# Altium schematic symbol library jlcpcb_2025_04_resistors_extended_1210.schlib: 2670 symbols (part 8 of 14) (continued)
## CR1210J30683G
designator R?  Resistance: 68kΩ  (hidden comment: *)
Resistor, 68kΩ, ±5%, 750mW, 200V, ±200ppm/℃, -55℃~+125℃, SMD 1210; Manufacturer: Uniroyal; Manufacturer Part Number: CR1210J30683G; Supplier 1: LCSC; Supplier Part Number 1: C102495; JLCPCB Part Number: C102495; Power Rating: 750mW; Category: Resistors; Package Size: 1210; JLCPCB Basic Part: Yes; Tolerance: ±5%; Voltage Rating: 200V; Temperature Coefficient: ±200ppm/℃; Temperature Rating: -55℃~+125℃; ComponentLink1Description: Datasheet; ComponentLink1URL: https://wmsc.lcsc.com/wmsc/upload/file/pdf/v2/lcsc/2304140030_LIZ-Elec-CR1210J30683G_C102495.pdf; ComponentLink2Description: JLCPCB Part URL; ComponentLink2URL: https://jlcpcb.com/partdetail/C102495
pins: 1, 2
1 alternate drawing of the same symbol

## CR1210J30750G
designator R?  Resistance: 75Ω  (hidden comment: *)
Resistor, 75Ω, ±5%, 750mW, 200V, ±200ppm/℃, -55℃~+125℃, SMD 1210; Manufacturer: Uniroyal; Manufacturer Part Number: CR1210J30750G; Supplier 1: LCSC; Supplier Part Number 1: C102497; JLCPCB Part Number: C102497; Power Rating: 750mW; Category: Resistors; Package Size: 1210; JLCPCB Basic Part: Yes; Tolerance: ±5%; Voltage Rating: 200V; Temperature Coefficient: ±200ppm/℃; Temperature Rating: -55℃~+125℃; ComponentLink1Description: Datasheet; ComponentLink1URL: https://wmsc.lcsc.com/wmsc/upload/file/pdf/v2/lcsc/2304140030_LIZ-Elec-CR1210J30750G_C102497.pdf; ComponentLink2Description: JLCPCB Part URL; ComponentLink2URL: https://jlcpcb.com/partdetail/C102497
pins: 1, 2
1 alternate drawing of the same symbol

## CR1210J30751G
designator R?  Resistance: 750Ω  (hidden comment: *)
Resistor, 750Ω, ±5%, 200V, SMD 1210; Manufacturer: Uniroyal; Manufacturer Part Number: CR1210J30751G; Supplier 1: LCSC; Supplier Part Number 1: C102498; JLCPCB Part Number: C102498; Category: Resistors; Package Size: 1210; JLCPCB Basic Part: Yes; Tolerance: ±5%; Voltage Rating: 200V; ComponentLink1Description: Datasheet; ComponentLink1URL: https://wmsc.lcsc.com/wmsc/upload/file/pdf/v2/lcsc/2304140030_LIZ-Elec-CR1210J30751G_C102498.pdf; ComponentLink2Description: JLCPCB Part URL; ComponentLink2URL: https://jlcpcb.com/partdetail/C102498
pins: 1, 2
1 alternate drawing of the same symbol

## CR1210J30820G
designator R?  Resistance: 82Ω  (hidden comment: *)
Resistor, 82Ω, ±5%, 750mW, 200V, ±200ppm/℃, -55℃~+125℃, SMD 1210; Manufacturer: Uniroyal; Manufacturer Part Number: CR1210J30820G; Supplier 1: LCSC; Supplier Part Number 1: C102502; JLCPCB Part Number: C102502; Power Rating: 750mW; Category: Resistors; Package Size: 1210; JLCPCB Basic Part: Yes; Tolerance: ±5%; Voltage Rating: 200V; Temperature Coefficient: ±200ppm/℃; Temperature Rating: -55℃~+125℃; ComponentLink1Description: Datasheet; ComponentLink1URL: https://wmsc.lcsc.com/wmsc/upload/file/pdf/v2/lcsc/2304140030_LIZ-Elec-CR1210J30820G_C102502.pdf; ComponentLink2Description: JLCPCB Part URL; ComponentLink2URL: https://jlcpcb.com/partdetail/C102502
pins: 1, 2
1 alternate drawing of the same symbol

## CR1210JR020P05Z
designator R?  Resistance: 20mΩ  (hidden comment: *)
Resistor, 20mΩ, ±5%, 500mW, 200V, -55℃~+155℃, SMD 1210; Manufacturer: Uniroyal; Manufacturer Part Number: CR1210JR020P05Z; Supplier 1: LCSC; Supplier Part Number 1: C149712; JLCPCB Part Number: C149712; Power Rating: 500mW; Category: Resistors; Package Size: 1210; JLCPCB Basic Part: Yes; Tolerance: ±5%; Voltage Rating: 200V; Temperature Rating: -55℃~+155℃; ComponentLink1Description: Datasheet; ComponentLink1URL: https://wmsc.lcsc.com/wmsc/upload/file/pdf/v2/lcsc/2304140030_Ever-Ohms-Tech-CR1210JR020P05Z_C149712.pdf; ComponentLink2Description: JLCPCB Part URL; ComponentLink2URL: https://jlcpcb.com/partdetail/C149712
pins: 1, 2
1 alternate drawing of the same symbol

## CR1210JR050P05R
designator R?  Resistance: 50mΩ  (hidden comment: *)
Resistor, 50mΩ, ±5%, 500mW, 200V, -55℃~+155℃, SMD 1210; Manufacturer: Uniroyal; Manufacturer Part Number: CR1210JR050P05R; Supplier 1: LCSC; Supplier Part Number 1: C149714; JLCPCB Part Number: C149714; Power Rating: 500mW; Category: Resistors; Package Size: 1210; JLCPCB Basic Part: Yes; Tolerance: ±5%; Voltage Rating: 200V; Temperature Rating: -55℃~+155℃; ComponentLink1Description: Datasheet; ComponentLink1URL: https://wmsc.lcsc.com/wmsc/upload/file/pdf/v2/lcsc/2304140030_Ever-Ohms-Tech-CR1210JR050P05R_C149714.pdf; ComponentLink2Description: JLCPCB Part URL; ComponentLink2URL: https://jlcpcb.com/partdetail/C149714
pins: 1, 2
1 alternate drawing of the same symbol

## CR1210JR091P05R
designator R?  Resistance: 91mΩ  (hidden comment: *)
Resistor, 91mΩ, ±5%, 500mW, 200V, -55℃~+155℃, SMD 1210; Manufacturer: Uniroyal; Manufacturer Part Number: CR1210JR091P05R; Supplier 1: LCSC; Supplier Part Number 1: C149715; JLCPCB Part Number: C149715; Power Rating: 500mW; Category: Resistors; Package Size: 1210; JLCPCB Basic Part: Yes; Tolerance: ±5%; Voltage Rating: 200V; Temperature Rating: -55℃~+155℃; ComponentLink1Description: Datasheet; ComponentLink1URL: https://wmsc.lcsc.com/wmsc/upload/file/pdf/v2/lcsc/2304140030_Ever-Ohms-Tech-CR1210JR091P05R_C149715.pdf; ComponentLink2Description: JLCPCB Part URL; ComponentLink2URL: https://jlcpcb.com/partdetail/C149715
pins: 1, 2
1 alternate drawing of the same symbol

## CR1210JR120P05R
designator R?  Resistance: 120mΩ  (hidden comment: *)
Resistor, 120mΩ, ±5%, 500mW, 200V, -55℃~+155℃, SMD 1210; Manufacturer: Uniroyal; Manufacturer Part Number: CR1210JR120P05R; Supplier 1: LCSC; Supplier Part Number 1: C149716; JLCPCB Part Number: C149716; Power Rating: 500mW; Category: Resistors; Package Size: 1210; JLCPCB Basic Part: Yes; Tolerance: ±5%; Voltage Rating: 200V; Temperature Rating: -55℃~+155℃; ComponentLink1Description: Datasheet; ComponentLink1URL: https://wmsc.lcsc.com/wmsc/upload/file/pdf/v2/lcsc/2304140030_Ever-Ohms-Tech-CR1210JR120P05R_C149716.pdf; ComponentLink2Description: JLCPCB Part URL; ComponentLink2URL: https://jlcpcb.com/partdetail/C149716
pins: 1, 2
1 alternate drawing of the same symbol

## CR1210JR150P05R
designator R?  Resistance: 150mΩ  (hidden comment: *)
Resistor, 150mΩ, ±5%, 500mW, 200V, -55℃~+155℃, SMD 1210; Manufacturer: Uniroyal; Manufacturer Part Number: CR1210JR150P05R; Supplier 1: LCSC; Supplier Part Number 1: C149717; JLCPCB Part Number: C149717; Power Rating: 500mW; Category: Resistors; Package Size: 1210; JLCPCB Basic Part: Yes; Tolerance: ±5%; Voltage Rating: 200V; Temperature Rating: -55℃~+155℃; ComponentLink1Description: Datasheet; ComponentLink1URL: https://wmsc.lcsc.com/wmsc/upload/file/pdf/v2/lcsc/2304140030_Ever-Ohms-Tech-CR1210JR150P05R_C149717.pdf; ComponentLink2Description: JLCPCB Part URL; ComponentLink2URL: https://jlcpcb.com/partdetail/C149717
pins: 1, 2
1 alternate drawing of the same symbol

## CR1210JR220P05R
designator R?  Resistance: 220mΩ  (hidden comment: *)
Resistor, 220mΩ, ±5%, 500mW, 200V, -55℃~+155℃, SMD 1210; Manufacturer: Uniroyal; Manufacturer Part Number: CR1210JR220P05R; Supplier 1: LCSC; Supplier Part Number 1: C149718; JLCPCB Part Number: C149718; Power Rating: 500mW; Category: Resistors; Package Size: 1210; JLCPCB Basic Part: Yes; Tolerance: ±5%; Voltage Rating: 200V; Temperature Rating: -55℃~+155℃; ComponentLink1Description: Datasheet; ComponentLink1URL: https://wmsc.lcsc.com/wmsc/upload/file/pdf/v2/lcsc/2304140030_Ever-Ohms-Tech-CR1210JR220P05R_C149718.pdf; ComponentLink2Description: JLCPCB Part URL; ComponentLink2URL: https://jlcpcb.com/partdetail/C149718
pins: 1, 2
1 alternate drawing of the same symbol

## CR1210JR300P05R
designator R?  Resistance: 300mΩ  (hidden comment: *)
Resistor, 300mΩ, ±5%, 500mW, 200V, -55℃~+155℃, SMD 1210; Manufacturer: Uniroyal; Manufacturer Part Number: CR1210JR300P05R; Supplier 1: LCSC; Supplier Part Number 1: C149719; JLCPCB Part Number: C149719; Power Rating: 500mW; Category: Resistors; Package Size: 1210; JLCPCB Basic Part: Yes; Tolerance: ±5%; Voltage Rating: 200V; Temperature Rating: -55℃~+155℃; ComponentLink1Description: Datasheet; ComponentLink1URL: https://wmsc.lcsc.com/wmsc/upload/file/pdf/v2/lcsc/2304140030_Ever-Ohms-Tech-CR1210JR300P05R_C149719.pdf; ComponentLink2Description: JLCPCB Part URL; ComponentLink2URL: https://jlcpcb.com/partdetail/C149719
pins: 1, 2
1 alternate drawing of the same symbol

## CR1210JR500P05R
designator R?  Resistance: 500mΩ  (hidden comment: *)
Resistor, 500mΩ, ±5%, 500mW, 200V, -55℃~+155℃, SMD 1210; Manufacturer: Uniroyal; Manufacturer Part Number: CR1210JR500P05R; Supplier 1: LCSC; Supplier Part Number 1: C149722; JLCPCB Part Number: C149722; Power Rating: 500mW; Category: Resistors; Package Size: 1210; JLCPCB Basic Part: Yes; Tolerance: ±5%; Voltage Rating: 200V; Temperature Rating: -55℃~+155℃; ComponentLink1Description: Datasheet; ComponentLink1URL: https://wmsc.lcsc.com/wmsc/upload/file/pdf/v2/lcsc/2304140030_Ever-Ohms-Tech-CR1210JR500P05R_C149722.pdf; ComponentLink2Description: JLCPCB Part URL; ComponentLink2URL: https://jlcpcb.com/partdetail/C149722
pins: 1, 2
1 alternate drawing of the same symbol

## CR1210JR560P05R
designator R?  Resistance: 560mΩ  (hidden comment: *)
Resistor, 560mΩ, ±5%, 500mW, 200V, -55℃~+155℃, SMD 1210; Manufacturer: Uniroyal; Manufacturer Part Number: CR1210JR560P05R; Supplier 1: LCSC; Supplier Part Number 1: C149721; JLCPCB Part Number: C149721; Power Rating: 500mW; Category: Resistors; Package Size: 1210; JLCPCB Basic Part: Yes; Tolerance: ±5%; Voltage Rating: 200V; Temperature Rating: -55℃~+155℃; ComponentLink1Description: Datasheet; ComponentLink1URL: https://wmsc.lcsc.com/wmsc/upload/file/pdf/v2/lcsc/2304140030_Ever-Ohms-Tech-CR1210JR560P05R_C149721.pdf; ComponentLink2Description: JLCPCB Part URL; ComponentLink2URL: https://jlcpcb.com/partdetail/C149721
pins: 1, 2
1 alternate drawing of the same symbol

## CR1210JR620P05R
designator R?  Resistance: 620mΩ  (hidden comment: *)
Resistor, 620mΩ, ±5%, 500mW, 200V, -55℃~+155℃, SMD 1210; Manufacturer: Uniroyal; Manufacturer Part Number: CR1210JR620P05R; Supplier 1: LCSC; Supplier Part Number 1: C149723; JLCPCB Part Number: C149723; Power Rating: 500mW; Category: Resistors; Package Size: 1210; JLCPCB Basic Part: Yes; Tolerance: ±5%; Voltage Rating: 200V; Temperature Rating: -55℃~+155℃; ComponentLink1Description: Datasheet; ComponentLink1URL: https://wmsc.lcsc.com/wmsc/upload/file/pdf/v2/lcsc/2304140030_Ever-Ohms-Tech-CR1210JR620P05R_C149723.pdf; ComponentLink2Description: JLCPCB Part URL; ComponentLink2URL: https://jlcpcb.com/partdetail/C149723
pins: 1, 2
1 alternate drawing of the same symbol

## CR1210JR800P05R
designator R?  Resistance: 800mΩ  (hidden comment: *)
Resistor, 800mΩ, ±5%, 500mW, 200V, -55℃~+155℃, SMD 1210; Manufacturer: Uniroyal; Manufacturer Part Number: CR1210JR800P05R; Supplier 1: LCSC; Supplier Part Number 1: C149725; JLCPCB Part Number: C149725; Power Rating: 500mW; Category: Resistors; Package Size: 1210; JLCPCB Basic Part: Yes; Tolerance: ±5%; Voltage Rating: 200V; Temperature Rating: -55℃~+155℃; ComponentLink1Description: Datasheet; ComponentLink1URL: https://wmsc.lcsc.com/wmsc/upload/file/pdf/v2/lcsc/2304140030_Ever-Ohms-Tech-CR1210JR800P05R_C149725.pdf; ComponentLink2Description: JLCPCB Part URL; ComponentLink2URL: https://jlcpcb.com/partdetail/C149725
pins: 1, 2
1 alternate drawing of the same symbol

## CR-10FA7--200R
designator R?  Resistance: 200Ω  (hidden comment: *)
Resistor, 200Ω, ±1%, 333.333mW, 200V, -55℃~+155℃, SMD 1210; Manufacturer: Uniroyal; Manufacturer Part Number: CR-10FA7--200R; Supplier 1: LCSC; Supplier Part Number 1: C285233; JLCPCB Part Number: C285233; Power Rating: 333.333mW; Category: Resistors; Package Size: 1210; JLCPCB Basic Part: Yes; Tolerance: ±1%; Voltage Rating: 200V; Temperature Rating: -55℃~+155℃; ComponentLink1Description: Datasheet; ComponentLink1URL: https://wmsc.lcsc.com/wmsc/upload/file/pdf/v2/lcsc/2304140030_Viking-Tech-CR-10FA7--200R_C285233.pdf; ComponentLink2Description: JLCPCB Part URL; ComponentLink2URL: https://jlcpcb.com/partdetail/C285233
pins: 1, 2
1 alternate drawing of the same symbol

## CR-10FL7---4R7
designator R?  Resistance: 4.7Ω  (hidden comment: *)
Resistor, 4.7Ω, ±1%, 333.333mW, 200V, ±200ppm/℃, -55℃~+155℃, SMD 1210; Manufacturer: Uniroyal; Manufacturer Part Number: CR-10FL7---4R7; Supplier 1: LCSC; Supplier Part Number 1: C468527; JLCPCB Part Number: C468527; Power Rating: 333.333mW; Category: Resistors; Package Size: 1210; JLCPCB Basic Part: Yes; Tolerance: ±1%; Voltage Rating: 200V; Temperature Coefficient: ±200ppm/℃; Temperature Rating: -55℃~+155℃; ComponentLink1Description: Datasheet; ComponentLink1URL: https://wmsc.lcsc.com/wmsc/upload/file/pdf/v2/lcsc/2304140030_Viking-Tech-CR-10FL7---4R7_C468527.pdf; ComponentLink2Description: JLCPCB Part URL; ComponentLink2URL: https://jlcpcb.com/partdetail/C468527
pins: 1, 2
1 alternate drawing of the same symbol

## CR-10JP7---10R
designator R?  Resistance: 10Ω  (hidden comment: *)
Resistor, 10Ω, ±5%, 333.333mW, ±100ppm/℃, SMD 1210; Manufacturer: Uniroyal; Manufacturer Part Number: CR-10JP7---10R; Supplier 1: LCSC; Supplier Part Number 1: C881911; JLCPCB Part Number: C881911; Power Rating: 333.333mW; Category: Resistors; Package Size: 1210; JLCPCB Basic Part: Yes; Tolerance: ±5%; Temperature Coefficient: ±100ppm/℃; ComponentLink1Description: Datasheet; ComponentLink1URL: https://wmsc.lcsc.com/wmsc/upload/file/pdf/v2/lcsc/2304140030_Viking-Tech-CR-10JP7---10R_C881911.pdf; ComponentLink2Description: JLCPCB Part URL; ComponentLink2URL: https://jlcpcb.com/partdetail/C881911
pins: 1, 2
1 alternate drawing of the same symbol

## CRCW12101M00FKEA
designator R?  Resistance: 1MΩ  (hidden comment: *)
Resistor, 1MΩ, ±1%, 500mW, ±100ppm/℃, -55℃~+155℃, SMD 1210; Manufacturer: Uniroyal; Manufacturer Part Number: CRCW12101M00FKEA; Supplier 1: LCSC; Supplier Part Number 1: C844444; JLCPCB Part Number: C844444; Power Rating: 500mW; Category: Resistors; Package Size: 1210; JLCPCB Basic Part: Yes; Tolerance: ±1%; Temperature Coefficient: ±100ppm/℃; Temperature Rating: -55℃~+155℃; ComponentLink1Description: Datasheet; ComponentLink1URL: https://wmsc.lcsc.com/wmsc/upload/file/pdf/v2/lcsc/2312131902_Vishay-Intertech-CRCW12101M00FKEA_C844444.pdf; ComponentLink2Description: JLCPCB Part URL; ComponentLink2URL: https://jlcpcb.com/partdetail/C844444
pins: 1, 2
1 alternate drawing of the same symbol

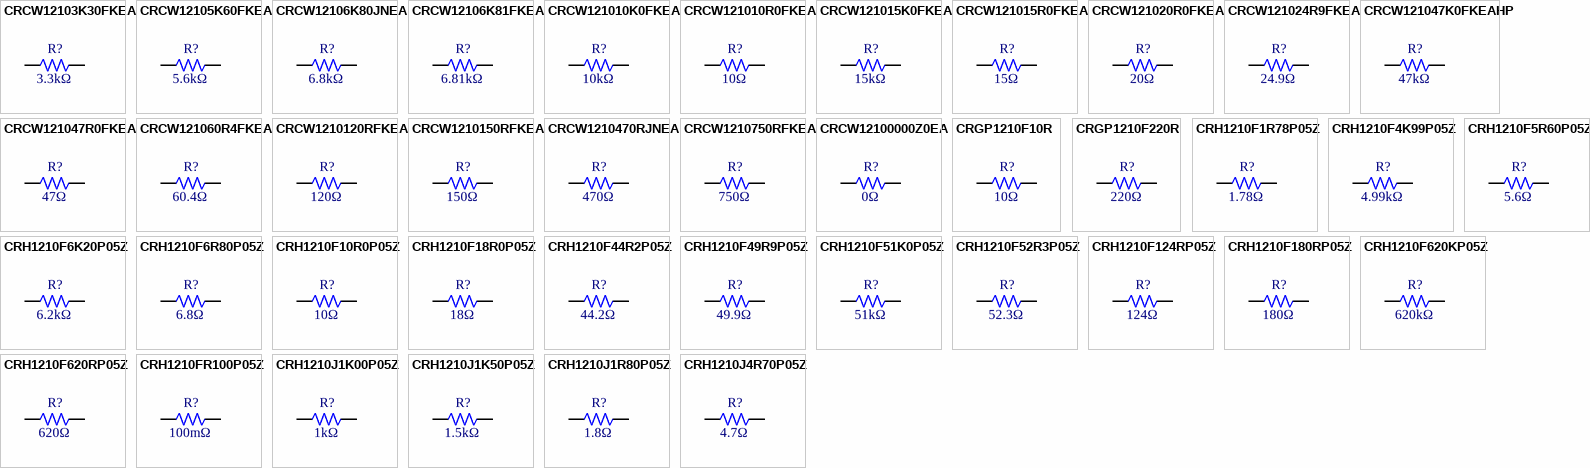
[diagram p38: symbols CRCW12103K30FKEA to CRH1210J4R70P05Z]

## CRCW12103K30FKEA
designator R?  Resistance: 3.3kΩ  (hidden comment: *)
Resistor, 3.3kΩ, ±1%, 500mW, 300V, ±100ppm/℃, -55℃~+155℃, SMD 1210; Manufacturer: Uniroyal; Manufacturer Part Number: CRCW12103K30FKEA; Supplier 1: LCSC; Supplier Part Number 1: C2077955; JLCPCB Part Number: C2077955; Power Rating: 500mW; Category: Resistors; Package Size: 1210; JLCPCB Basic Part: Yes; Tolerance: ±1%; Voltage Rating: 300V; Temperature Coefficient: ±100ppm/℃; Temperature Rating: -55℃~+155℃; ComponentLink1Description: Datasheet; ComponentLink1URL: https://wmsc.lcsc.com/wmsc/upload/file/pdf/v2/lcsc/2304140030_Vishay-Intertech-CRCW12103K30FKEA_C2077955.pdf; ComponentLink2Description: JLCPCB Part URL; ComponentLink2URL: https://jlcpcb.com/partdetail/C2077955
pins: 1, 2
1 alternate drawing of the same symbol

## CRCW12105K60FKEA
designator R?  Resistance: 5.6kΩ  (hidden comment: *)
Resistor, 5.6kΩ, ±1%, 500mW, 300V, ±100ppm/K, -55℃~+155℃, SMD 1210; Manufacturer: Uniroyal; Manufacturer Part Number: CRCW12105K60FKEA; Supplier 1: LCSC; Supplier Part Number 1: C2079048; JLCPCB Part Number: C2079048; Power Rating: 500mW; Category: Resistors; Package Size: 1210; JLCPCB Basic Part: Yes; Tolerance: ±1%; Voltage Rating: 300V; Temperature Coefficient: ±100ppm/K; Temperature Rating: -55℃~+155℃; ComponentLink1Description: Datasheet; ComponentLink1URL: https://wmsc.lcsc.com/wmsc/upload/file/pdf/v2/lcsc/2304140030_Vishay-Intertech-CRCW12105K60FKEA_C2079048.pdf; ComponentLink2Description: JLCPCB Part URL; ComponentLink2URL: https://jlcpcb.com/partdetail/C2079048
pins: 1, 2
1 alternate drawing of the same symbol

## CRCW12106K80JNEA
designator R?  Resistance: 6.8kΩ  (hidden comment: *)
Resistor, 6.8kΩ, ±5%, 500mW, 200V, ±200ppm/℃, -55℃~+155℃, SMD 1210; Manufacturer: Uniroyal; Manufacturer Part Number: CRCW12106K80JNEA; Supplier 1: LCSC; Supplier Part Number 1: C2080931; JLCPCB Part Number: C2080931; Power Rating: 500mW; Category: Resistors; Package Size: 1210; JLCPCB Basic Part: Yes; Tolerance: ±5%; Voltage Rating: 200V; Temperature Coefficient: ±200ppm/℃; Temperature Rating: -55℃~+155℃; ComponentLink1Description: Datasheet; ComponentLink1URL: https://wmsc.lcsc.com/wmsc/upload/file/pdf/v2/lcsc/2304140030_Vishay-Intertech-CRCW12106K80JNEA_C2080931.pdf; ComponentLink2Description: JLCPCB Part URL; ComponentLink2URL: https://jlcpcb.com/partdetail/C2080931
pins: 1, 2
1 alternate drawing of the same symbol

## CRCW12106K81FKEA
designator R?  Resistance: 6.81kΩ  (hidden comment: *)
Resistor, 6.81kΩ, ±1%, 500mW, 300V, ±100ppm/℃, -55℃~+155℃, SMD 1210; Manufacturer: Uniroyal; Manufacturer Part Number: CRCW12106K81FKEA; Supplier 1: LCSC; Supplier Part Number 1: C2081092; JLCPCB Part Number: C2081092; Power Rating: 500mW; Category: Resistors; Package Size: 1210; JLCPCB Basic Part: Yes; Tolerance: ±1%; Voltage Rating: 300V; Temperature Coefficient: ±100ppm/℃; Temperature Rating: -55℃~+155℃; ComponentLink1Description: Datasheet; ComponentLink1URL: https://wmsc.lcsc.com/wmsc/upload/file/pdf/v2/lcsc/2304140030_Vishay-Intertech-CRCW12106K81FKEA_C2081092.pdf; ComponentLink2Description: JLCPCB Part URL; ComponentLink2URL: https://jlcpcb.com/partdetail/C2081092
pins: 1, 2
1 alternate drawing of the same symbol

## CRCW121010K0FKEA
designator R?  Resistance: 10kΩ  (hidden comment: *)
Resistor, 10kΩ, ±1%, 500mW, 300V, ±100ppm/K, -55℃~+155℃, SMD 1210; Manufacturer: Uniroyal; Manufacturer Part Number: CRCW121010K0FKEA; Supplier 1: LCSC; Supplier Part Number 1: C844441; JLCPCB Part Number: C844441; Power Rating: 500mW; Category: Resistors; Package Size: 1210; JLCPCB Basic Part: Yes; Tolerance: ±1%; Voltage Rating: 300V; Temperature Coefficient: ±100ppm/K; Temperature Rating: -55℃~+155℃; ComponentLink1Description: Datasheet; ComponentLink1URL: https://wmsc.lcsc.com/wmsc/upload/file/pdf/v2/lcsc/2304140030_Vishay-Intertech-CRCW121010K0FKEA_C844441.pdf; ComponentLink2Description: JLCPCB Part URL; ComponentLink2URL: https://jlcpcb.com/partdetail/C844441
pins: 1, 2
1 alternate drawing of the same symbol

## CRCW121010R0FKEA
designator R?  Resistance: 10Ω  (hidden comment: *)
Resistor, 10Ω, ±1%, 500mW, 300V, ±100ppm/℃, -55℃~+155℃, SMD 1210; Manufacturer: Uniroyal; Manufacturer Part Number: CRCW121010R0FKEA; Supplier 1: LCSC; Supplier Part Number 1: C844881; JLCPCB Part Number: C844881; Power Rating: 500mW; Category: Resistors; Package Size: 1210; JLCPCB Basic Part: Yes; Tolerance: ±1%; Voltage Rating: 300V; Temperature Coefficient: ±100ppm/℃; Temperature Rating: -55℃~+155℃; ComponentLink1Description: Datasheet; ComponentLink1URL: https://wmsc.lcsc.com/wmsc/upload/file/pdf/v2/lcsc/2304140030_Vishay-Intertech-CRCW121010R0FKEA_C844881.pdf; ComponentLink2Description: JLCPCB Part URL; ComponentLink2URL: https://jlcpcb.com/partdetail/C844881
pins: 1, 2
1 alternate drawing of the same symbol

## CRCW121015K0FKEA
designator R?  Resistance: 15kΩ  (hidden comment: *)
Resistor, 15kΩ, ±1%, 500mW, ±100ppm/℃, -55℃~+155℃, SMD 1210; Manufacturer: Uniroyal; Manufacturer Part Number: CRCW121015K0FKEA; Supplier 1: LCSC; Supplier Part Number 1: C4085234; JLCPCB Part Number: C4085234; Power Rating: 500mW; Category: Resistors; Package Size: 1210; JLCPCB Basic Part: Yes; Tolerance: ±1%; Temperature Coefficient: ±100ppm/℃; Temperature Rating: -55℃~+155℃; ComponentLink1Description: Datasheet; ComponentLink1URL: https://wmsc.lcsc.com/wmsc/upload/file/pdf/v2/lcsc/2312130958_Vishay-Intertech-CRCW121015K0FKEA_C4085234.pdf; ComponentLink2Description: JLCPCB Part URL; ComponentLink2URL: https://jlcpcb.com/partdetail/C4085234
pins: 1, 2
1 alternate drawing of the same symbol

## CRCW121015R0FKEA
designator R?  Resistance: 15Ω  (hidden comment: *)
Resistor, 15Ω, ±1%, 500mW, 200V, ±100ppm/℃, -55℃~+155℃, SMD 1210; Manufacturer: Uniroyal; Manufacturer Part Number: CRCW121015R0FKEA; Supplier 1: LCSC; Supplier Part Number 1: C2077909; JLCPCB Part Number: C2077909; Power Rating: 500mW; Category: Resistors; Package Size: 1210; JLCPCB Basic Part: Yes; Tolerance: ±1%; Voltage Rating: 200V; Temperature Coefficient: ±100ppm/℃; Temperature Rating: -55℃~+155℃; ComponentLink1Description: Datasheet; ComponentLink1URL: https://wmsc.lcsc.com/wmsc/upload/file/pdf/v2/lcsc/2304140030_Vishay-Intertech-CRCW121015R0FKEA_C2077909.pdf; ComponentLink2Description: JLCPCB Part URL; ComponentLink2URL: https://jlcpcb.com/partdetail/C2077909
pins: 1, 2
1 alternate drawing of the same symbol

## CRCW121020R0FKEA
designator R?  Resistance: 20Ω  (hidden comment: *)
Resistor, 20Ω, ±1%, 500mW, ±100ppm/℃, -55℃~+155℃, SMD 1210; Manufacturer: Uniroyal; Manufacturer Part Number: CRCW121020R0FKEA; Supplier 1: LCSC; Supplier Part Number 1: C4106877; JLCPCB Part Number: C4106877; Power Rating: 500mW; Category: Resistors; Package Size: 1210; JLCPCB Basic Part: Yes; Tolerance: ±1%; Temperature Coefficient: ±100ppm/℃; Temperature Rating: -55℃~+155℃; ComponentLink1Description: Datasheet; ComponentLink1URL: https://wmsc.lcsc.com/wmsc/upload/file/pdf/v2/lcsc/2312131010_Vishay-Intertech-CRCW121020R0FKEA_C4106877.pdf; ComponentLink2Description: JLCPCB Part URL; ComponentLink2URL: https://jlcpcb.com/partdetail/C4106877
pins: 1, 2
1 alternate drawing of the same symbol

## CRCW121024R9FKEA
designator R?  Resistance: 24.9Ω  (hidden comment: *)
Resistor, 24.9Ω, ±1%, 500mW, 200V, ±100ppm/℃, -55℃~+155℃, SMD 1210; Manufacturer: Uniroyal; Manufacturer Part Number: CRCW121024R9FKEA; Supplier 1: LCSC; Supplier Part Number 1: C2077946; JLCPCB Part Number: C2077946; Power Rating: 500mW; Category: Resistors; Package Size: 1210; JLCPCB Basic Part: Yes; Tolerance: ±1%; Voltage Rating: 200V; Temperature Coefficient: ±100ppm/℃; Temperature Rating: -55℃~+155℃; ComponentLink1Description: Datasheet; ComponentLink1URL: https://wmsc.lcsc.com/wmsc/upload/file/pdf/v2/lcsc/2304140030_Vishay-Intertech-CRCW121024R9FKEA_C2077946.pdf; ComponentLink2Description: JLCPCB Part URL; ComponentLink2URL: https://jlcpcb.com/partdetail/C2077946
pins: 1, 2
1 alternate drawing of the same symbol

## CRCW121047K0FKEAHP
designator R?  Resistance: 47kΩ  (hidden comment: *)
Resistor, 47kΩ, ±1%, 750mW, 200V, ±100ppm/℃, -55℃~+155℃, SMD 1210; Manufacturer: Uniroyal; Manufacturer Part Number: CRCW121047K0FKEAHP; Supplier 1: LCSC; Supplier Part Number 1: C2079113; JLCPCB Part Number: C2079113; Power Rating: 750mW; Category: Resistors; Package Size: 1210; JLCPCB Basic Part: Yes; Tolerance: ±1%; Voltage Rating: 200V; Temperature Coefficient: ±100ppm/℃; Temperature Rating: -55℃~+155℃; ComponentLink1Description: Datasheet; ComponentLink1URL: https://wmsc.lcsc.com/wmsc/upload/file/pdf/v2/lcsc/2304140030_Vishay-Intertech-CRCW121047K0FKEAHP_C2079113.pdf; ComponentLink2Description: JLCPCB Part URL; ComponentLink2URL: https://jlcpcb.com/partdetail/C2079113
pins: 1, 2
1 alternate drawing of the same symbol

## CRCW121047R0FKEA
designator R?  Resistance: 47Ω  (hidden comment: *)
Resistor, 47Ω, ±1%, 500mW, ±100ppm/℃, -55℃~+155℃, SMD 1210; Manufacturer: Uniroyal; Manufacturer Part Number: CRCW121047R0FKEA; Supplier 1: LCSC; Supplier Part Number 1: C3966771; JLCPCB Part Number: C3966771; Power Rating: 500mW; Category: Resistors; Package Size: 1210; JLCPCB Basic Part: Yes; Tolerance: ±1%; Temperature Coefficient: ±100ppm/℃; Temperature Rating: -55℃~+155℃; ComponentLink1Description: Datasheet; ComponentLink1URL: https://wmsc.lcsc.com/wmsc/upload/file/pdf/v2/lcsc/2312121734_Vishay-Intertech-CRCW121047R0FKEA_C3966771.pdf; ComponentLink2Description: JLCPCB Part URL; ComponentLink2URL: https://jlcpcb.com/partdetail/C3966771
pins: 1, 2
1 alternate drawing of the same symbol

## CRCW121060R4FKEA
designator R?  Resistance: 60.4Ω  (hidden comment: *)
Resistor, 60.4Ω, ±1%, 500mW, 300V, ±100ppm/℃, -55℃~+155℃, SMD 1210; Manufacturer: Uniroyal; Manufacturer Part Number: CRCW121060R4FKEA; Supplier 1: LCSC; Supplier Part Number 1: C2077840; JLCPCB Part Number: C2077840; Power Rating: 500mW; Category: Resistors; Package Size: 1210; JLCPCB Basic Part: Yes; Tolerance: ±1%; Voltage Rating: 300V; Temperature Coefficient: ±100ppm/℃; Temperature Rating: -55℃~+155℃; ComponentLink1Description: Datasheet; ComponentLink1URL: https://wmsc.lcsc.com/wmsc/upload/file/pdf/v2/lcsc/2304140030_Vishay-Intertech-CRCW121060R4FKEA_C2077840.pdf; ComponentLink2Description: JLCPCB Part URL; ComponentLink2URL: https://jlcpcb.com/partdetail/C2077840
pins: 1, 2
1 alternate drawing of the same symbol

## CRCW1210120RFKEA
designator R?  Resistance: 120Ω  (hidden comment: *)
Resistor, 120Ω, ±1%, 500mW, 200V, ±100ppm/℃, -55℃~+155℃, SMD 1210; Manufacturer: Uniroyal; Manufacturer Part Number: CRCW1210120RFKEA; Supplier 1: LCSC; Supplier Part Number 1: C844443; JLCPCB Part Number: C844443; Power Rating: 500mW; Category: Resistors; Package Size: 1210; JLCPCB Basic Part: Yes; Tolerance: ±1%; Voltage Rating: 200V; Temperature Coefficient: ±100ppm/℃; Temperature Rating: -55℃~+155℃; ComponentLink1Description: Datasheet; ComponentLink1URL: https://wmsc.lcsc.com/wmsc/upload/file/pdf/v2/lcsc/2304140030_Vishay-Intertech-CRCW1210120RFKEA_C844443.pdf; ComponentLink2Description: JLCPCB Part URL; ComponentLink2URL: https://jlcpcb.com/partdetail/C844443
pins: 1, 2
1 alternate drawing of the same symbol

## CRCW1210150RFKEA
designator R?  Resistance: 150Ω  (hidden comment: *)
Resistor, 150Ω, ±1%, 500mW, 300V, ±100ppm/K, -55℃~+155℃, SMD 1210; Manufacturer: Uniroyal; Manufacturer Part Number: CRCW1210150RFKEA; Supplier 1: LCSC; Supplier Part Number 1: C844045; JLCPCB Part Number: C844045; Power Rating: 500mW; Category: Resistors; Package Size: 1210; JLCPCB Basic Part: Yes; Tolerance: ±1%; Voltage Rating: 300V; Temperature Coefficient: ±100ppm/K; Temperature Rating: -55℃~+155℃; ComponentLink1Description: Datasheet; ComponentLink1URL: https://wmsc.lcsc.com/wmsc/upload/file/pdf/v2/lcsc/2304140030_Vishay-Intertech-CRCW1210150RFKEA_C844045.pdf; ComponentLink2Description: JLCPCB Part URL; ComponentLink2URL: https://jlcpcb.com/partdetail/C844045
pins: 1, 2
1 alternate drawing of the same symbol

## CRCW1210470RJNEA
designator R?  Resistance: 470Ω  (hidden comment: *)
Resistor, 470Ω, ±5%, 500mW, 200V, ±200ppm/K, -55℃~+155℃, SMD 1210; Manufacturer: Uniroyal; Manufacturer Part Number: CRCW1210470RJNEA; Supplier 1: LCSC; Supplier Part Number 1: C242478; JLCPCB Part Number: C242478; Power Rating: 500mW; Category: Resistors; Package Size: 1210; JLCPCB Basic Part: Yes; Tolerance: ±5%; Voltage Rating: 200V; Temperature Coefficient: ±200ppm/K; Temperature Rating: -55℃~+155℃; ComponentLink1Description: Datasheet; ComponentLink1URL: https://wmsc.lcsc.com/wmsc/upload/file/pdf/v2/lcsc/2304140030_Vishay-Intertech-CRCW1210470RJNEA_C242478.pdf; ComponentLink2Description: JLCPCB Part URL; ComponentLink2URL: https://jlcpcb.com/partdetail/C242478
pins: 1, 2
1 alternate drawing of the same symbol

## CRCW1210750RFKEA
designator R?  Resistance: 750Ω  (hidden comment: *)
Resistor, 750Ω, ±1%, 500mW, 200V, ±100ppm/℃, -55℃~+155℃, SMD 1210; Manufacturer: Uniroyal; Manufacturer Part Number: CRCW1210750RFKEA; Supplier 1: LCSC; Supplier Part Number 1: C2079066; JLCPCB Part Number: C2079066; Power Rating: 500mW; Category: Resistors; Package Size: 1210; JLCPCB Basic Part: Yes; Tolerance: ±1%; Voltage Rating: 200V; Temperature Coefficient: ±100ppm/℃; Temperature Rating: -55℃~+155℃; ComponentLink1Description: Datasheet; ComponentLink1URL: https://wmsc.lcsc.com/wmsc/upload/file/pdf/v2/lcsc/2304140030_Vishay-Intertech-CRCW1210750RFKEA_C2079066.pdf; ComponentLink2Description: JLCPCB Part URL; ComponentLink2URL: https://jlcpcb.com/partdetail/C2079066
pins: 1, 2
1 alternate drawing of the same symbol

## CRCW12100000Z0EA
designator R?  Resistance: 0Ω  (hidden comment: *)
Resistor, 0Ω, 500mW, -55℃~+155℃, SMD 1210; Manufacturer: Uniroyal; Manufacturer Part Number: CRCW12100000Z0EA; Supplier 1: LCSC; Supplier Part Number 1: C844880; JLCPCB Part Number: C844880; Power Rating: 500mW; Category: Resistors; Package Size: 1210; JLCPCB Basic Part: Yes; Temperature Rating: -55℃~+155℃; ComponentLink1Description: Datasheet; ComponentLink1URL: https://wmsc.lcsc.com/wmsc/upload/file/pdf/v2/lcsc/2312131902_Vishay-Intertech-CRCW12100000Z0EA_C844880.pdf; ComponentLink2Description: JLCPCB Part URL; ComponentLink2URL: https://jlcpcb.com/partdetail/C844880
pins: 1, 2
1 alternate drawing of the same symbol

## CRGP1210F10R
designator R?  Resistance: 10Ω  (hidden comment: *)
Resistor, 10Ω, ±1%, 750mW, ±400ppm/℃, -55℃~+155℃, SMD 1210; Manufacturer: Uniroyal; Manufacturer Part Number: CRGP1210F10R; Supplier 1: LCSC; Supplier Part Number 1: C4104464; JLCPCB Part Number: C4104464; Power Rating: 750mW; Category: Resistors; Package Size: 1210; JLCPCB Basic Part: Yes; Tolerance: ±1%; Temperature Coefficient: ±400ppm/℃; Temperature Rating: -55℃~+155℃; ComponentLink1Description: Datasheet; ComponentLink2Description: JLCPCB Part URL; ComponentLink2URL: https://jlcpcb.com/partdetail/C4104464
pins: 1, 2
1 alternate drawing of the same symbol

## CRGP1210F220R
designator R?  Resistance: 220Ω  (hidden comment: *)
Resistor, 220Ω, ±1%, 750mW, ±100ppm/℃, -55℃~+155℃, SMD 1210; Manufacturer: Uniroyal; Manufacturer Part Number: CRGP1210F220R; Supplier 1: LCSC; Supplier Part Number 1: C3917340; JLCPCB Part Number: C3917340; Power Rating: 750mW; Category: Resistors; Package Size: 1210; JLCPCB Basic Part: Yes; Tolerance: ±1%; Temperature Coefficient: ±100ppm/℃; Temperature Rating: -55℃~+155℃; ComponentLink1Description: Datasheet; ComponentLink1URL: https://wmsc.lcsc.com/wmsc/upload/file/pdf/v2/lcsc/2403041535_TE-Connectivity-CRGP1210F220R_C3917340.pdf; ComponentLink2Description: JLCPCB Part URL; ComponentLink2URL: https://jlcpcb.com/partdetail/C3917340
pins: 1, 2
1 alternate drawing of the same symbol

## CRH1210F1R78P05Z
designator R?  Resistance: 1.78Ω  (hidden comment: *)
Resistor, 1.78Ω, ±1%, 660mW, 200V, ±400ppm/℃, -55℃~+155℃, SMD 1210; Manufacturer: Uniroyal; Manufacturer Part Number: CRH1210F1R78P05Z; Supplier 1: LCSC; Supplier Part Number 1: C174387; JLCPCB Part Number: C174387; Power Rating: 660mW; Category: Resistors; Package Size: 1210; JLCPCB Basic Part: Yes; Tolerance: ±1%; Voltage Rating: 200V; Temperature Coefficient: ±400ppm/℃; Temperature Rating: -55℃~+155℃; ComponentLink1Description: Datasheet; ComponentLink1URL: https://wmsc.lcsc.com/wmsc/upload/file/pdf/v2/lcsc/2304140030_Ever-Ohms-Tech-CRH1210F1R78P05Z_C174387.pdf; ComponentLink2Description: JLCPCB Part URL; ComponentLink2URL: https://jlcpcb.com/partdetail/C174387
pins: 1, 2
1 alternate drawing of the same symbol

## CRH1210F4K99P05Z
designator R?  Resistance: 4.99kΩ  (hidden comment: *)
Resistor, 4.99kΩ, ±1%, 660mW, 200V, ±100ppm/℃, -55℃~+155℃, SMD 1210; Manufacturer: Uniroyal; Manufacturer Part Number: CRH1210F4K99P05Z; Supplier 1: LCSC; Supplier Part Number 1: C174514; JLCPCB Part Number: C174514; Power Rating: 660mW; Category: Resistors; Package Size: 1210; JLCPCB Basic Part: Yes; Tolerance: ±1%; Voltage Rating: 200V; Temperature Coefficient: ±100ppm/℃; Temperature Rating: -55℃~+155℃; ComponentLink1Description: Datasheet; ComponentLink1URL: https://wmsc.lcsc.com/wmsc/upload/file/pdf/v2/lcsc/2304140030_Ever-Ohms-Tech-CRH1210F4K99P05Z_C174514.pdf; ComponentLink2Description: JLCPCB Part URL; ComponentLink2URL: https://jlcpcb.com/partdetail/C174514
pins: 1, 2
1 alternate drawing of the same symbol

## CRH1210F5R60P05Z
designator R?  Resistance: 5.6Ω  (hidden comment: *)
Resistor, 5.6Ω, ±1%, 660mW, 200V, ±400ppm/℃, -55℃~+155℃, SMD 1210; Manufacturer: Uniroyal; Manufacturer Part Number: CRH1210F5R60P05Z; Supplier 1: LCSC; Supplier Part Number 1: C174396; JLCPCB Part Number: C174396; Power Rating: 660mW; Category: Resistors; Package Size: 1210; JLCPCB Basic Part: Yes; Tolerance: ±1%; Voltage Rating: 200V; Temperature Coefficient: ±400ppm/℃; Temperature Rating: -55℃~+155℃; ComponentLink1Description: Datasheet; ComponentLink1URL: https://wmsc.lcsc.com/wmsc/upload/file/pdf/v2/lcsc/2304140030_Ever-Ohms-Tech-CRH1210F5R60P05Z_C174396.pdf; ComponentLink2Description: JLCPCB Part URL; ComponentLink2URL: https://jlcpcb.com/partdetail/C174396
pins: 1, 2
1 alternate drawing of the same symbol

## CRH1210F6K20P05Z
designator R?  Resistance: 6.2kΩ  (hidden comment: *)
Resistor, 6.2kΩ, ±1%, 660mW, 200V, ±100ppm/℃, -55℃~+155℃, SMD 1210; Manufacturer: Uniroyal; Manufacturer Part Number: CRH1210F6K20P05Z; Supplier 1: LCSC; Supplier Part Number 1: C174518; JLCPCB Part Number: C174518; Power Rating: 660mW; Category: Resistors; Package Size: 1210; JLCPCB Basic Part: Yes; Tolerance: ±1%; Voltage Rating: 200V; Temperature Coefficient: ±100ppm/℃; Temperature Rating: -55℃~+155℃; ComponentLink1Description: Datasheet; ComponentLink1URL: https://wmsc.lcsc.com/wmsc/upload/file/pdf/v2/lcsc/2304140030_Ever-Ohms-Tech-CRH1210F6K20P05Z_C174518.pdf; ComponentLink2Description: JLCPCB Part URL; ComponentLink2URL: https://jlcpcb.com/partdetail/C174518
pins: 1, 2
1 alternate drawing of the same symbol

## CRH1210F6R80P05Z
designator R?  Resistance: 6.8Ω  (hidden comment: *)
Resistor, 6.8Ω, ±1%, 660mW, 200V, ±400ppm/℃, -55℃~+155℃, SMD 1210; Manufacturer: Uniroyal; Manufacturer Part Number: CRH1210F6R80P05Z; Supplier 1: LCSC; Supplier Part Number 1: C174398; JLCPCB Part Number: C174398; Power Rating: 660mW; Category: Resistors; Package Size: 1210; JLCPCB Basic Part: Yes; Tolerance: ±1%; Voltage Rating: 200V; Temperature Coefficient: ±400ppm/℃; Temperature Rating: -55℃~+155℃; ComponentLink1Description: Datasheet; ComponentLink1URL: https://wmsc.lcsc.com/wmsc/upload/file/pdf/v2/lcsc/2304140030_Ever-Ohms-Tech-CRH1210F6R80P05Z_C174398.pdf; ComponentLink2Description: JLCPCB Part URL; ComponentLink2URL: https://jlcpcb.com/partdetail/C174398
pins: 1, 2
1 alternate drawing of the same symbol

## CRH1210F10R0P05Z
designator R?  Resistance: 10Ω  (hidden comment: *)
Resistor, 10Ω, ±1%, 660mW, 200V, ±100ppm/℃, -55℃~+155℃, SMD 1210; Manufacturer: Uniroyal; Manufacturer Part Number: CRH1210F10R0P05Z; Supplier 1: LCSC; Supplier Part Number 1: C174400; JLCPCB Part Number: C174400; Power Rating: 660mW; Category: Resistors; Package Size: 1210; JLCPCB Basic Part: Yes; Tolerance: ±1%; Voltage Rating: 200V; Temperature Coefficient: ±100ppm/℃; Temperature Rating: -55℃~+155℃; ComponentLink1Description: Datasheet; ComponentLink1URL: https://wmsc.lcsc.com/wmsc/upload/file/pdf/v2/lcsc/2304140030_Ever-Ohms-Tech-CRH1210F10R0P05Z_C174400.pdf; ComponentLink2Description: JLCPCB Part URL; ComponentLink2URL: https://jlcpcb.com/partdetail/C174400
pins: 1, 2
1 alternate drawing of the same symbol

## CRH1210F18R0P05Z
designator R?  Resistance: 18Ω  (hidden comment: *)
Resistor, 18Ω, ±1%, 660mW, 200V, ±100ppm/℃, -55℃~+155℃, SMD 1210; Manufacturer: Uniroyal; Manufacturer Part Number: CRH1210F18R0P05Z; Supplier 1: LCSC; Supplier Part Number 1: C174408; JLCPCB Part Number: C174408; Power Rating: 660mW; Category: Resistors; Package Size: 1210; JLCPCB Basic Part: Yes; Tolerance: ±1%; Voltage Rating: 200V; Temperature Coefficient: ±100ppm/℃; Temperature Rating: -55℃~+155℃; ComponentLink1Description: Datasheet; ComponentLink1URL: https://wmsc.lcsc.com/wmsc/upload/file/pdf/v2/lcsc/2304140030_Ever-Ohms-Tech-CRH1210F18R0P05Z_C174408.pdf; ComponentLink2Description: JLCPCB Part URL; ComponentLink2URL: https://jlcpcb.com/partdetail/C174408
pins: 1, 2
1 alternate drawing of the same symbol

## CRH1210F44R2P05Z
designator R?  Resistance: 44.2Ω  (hidden comment: *)
Resistor, 44.2Ω, ±1%, 660mW, 200V, ±100ppm/℃, -55℃~+155℃, SMD 1210; Manufacturer: Uniroyal; Manufacturer Part Number: CRH1210F44R2P05Z; Supplier 1: LCSC; Supplier Part Number 1: C174426; JLCPCB Part Number: C174426; Power Rating: 660mW; Category: Resistors; Package Size: 1210; JLCPCB Basic Part: Yes; Tolerance: ±1%; Voltage Rating: 200V; Temperature Coefficient: ±100ppm/℃; Temperature Rating: -55℃~+155℃; ComponentLink1Description: Datasheet; ComponentLink1URL: https://wmsc.lcsc.com/wmsc/upload/file/pdf/v2/lcsc/2304140030_Ever-Ohms-Tech-CRH1210F44R2P05Z_C174426.pdf; ComponentLink2Description: JLCPCB Part URL; ComponentLink2URL: https://jlcpcb.com/partdetail/C174426
pins: 1, 2
1 alternate drawing of the same symbol

## CRH1210F49R9P05Z
designator R?  Resistance: 49.9Ω  (hidden comment: *)
Resistor, 49.9Ω, ±1%, 660mW, 200V, ±100ppm/℃, -55℃~+155℃, SMD 1210; Manufacturer: Uniroyal; Manufacturer Part Number: CRH1210F49R9P05Z; Supplier 1: LCSC; Supplier Part Number 1: C174431; JLCPCB Part Number: C174431; Power Rating: 660mW; Category: Resistors; Package Size: 1210; JLCPCB Basic Part: Yes; Tolerance: ±1%; Voltage Rating: 200V; Temperature Coefficient: ±100ppm/℃; Temperature Rating: -55℃~+155℃; ComponentLink1Description: Datasheet; ComponentLink1URL: https://wmsc.lcsc.com/wmsc/upload/file/pdf/v2/lcsc/2304140030_Ever-Ohms-Tech-CRH1210F49R9P05Z_C174431.pdf; ComponentLink2Description: JLCPCB Part URL; ComponentLink2URL: https://jlcpcb.com/partdetail/C174431
pins: 1, 2
1 alternate drawing of the same symbol

## CRH1210F51K0P05Z
designator R?  Resistance: 51kΩ  (hidden comment: *)
Resistor, 51kΩ, ±1%, 660mW, 200V, ±100ppm/℃, -55℃~+155℃, SMD 1210; Manufacturer: Uniroyal; Manufacturer Part Number: CRH1210F51K0P05Z; Supplier 1: LCSC; Supplier Part Number 1: C174540; JLCPCB Part Number: C174540; Power Rating: 660mW; Category: Resistors; Package Size: 1210; JLCPCB Basic Part: Yes; Tolerance: ±1%; Voltage Rating: 200V; Temperature Coefficient: ±100ppm/℃; Temperature Rating: -55℃~+155℃; ComponentLink1Description: Datasheet; ComponentLink1URL: https://wmsc.lcsc.com/wmsc/upload/file/pdf/v2/lcsc/2304140030_Ever-Ohms-Tech-CRH1210F51K0P05Z_C174540.pdf; ComponentLink2Description: JLCPCB Part URL; ComponentLink2URL: https://jlcpcb.com/partdetail/C174540
pins: 1, 2
1 alternate drawing of the same symbol

## CRH1210F52R3P05Z
designator R?  Resistance: 52.3Ω  (hidden comment: *)
Resistor, 52.3Ω, ±1%, 660mW, 200V, ±100ppm/℃, -55℃~+155℃, SMD 1210; Manufacturer: Uniroyal; Manufacturer Part Number: CRH1210F52R3P05Z; Supplier 1: LCSC; Supplier Part Number 1: C174436; JLCPCB Part Number: C174436; Power Rating: 660mW; Category: Resistors; Package Size: 1210; JLCPCB Basic Part: Yes; Tolerance: ±1%; Voltage Rating: 200V; Temperature Coefficient: ±100ppm/℃; Temperature Rating: -55℃~+155℃; ComponentLink1Description: Datasheet; ComponentLink1URL: https://wmsc.lcsc.com/wmsc/upload/file/pdf/v2/lcsc/2304140030_Ever-Ohms-Tech-CRH1210F52R3P05Z_C174436.pdf; ComponentLink2Description: JLCPCB Part URL; ComponentLink2URL: https://jlcpcb.com/partdetail/C174436
pins: 1, 2
1 alternate drawing of the same symbol

## CRH1210F124RP05Z
designator R?  Resistance: 124Ω  (hidden comment: *)
Resistor, 124Ω, ±1%, 660mW, 200V, ±100ppm/℃, -55℃~+155℃, SMD 1210; Manufacturer: Uniroyal; Manufacturer Part Number: CRH1210F124RP05Z; Supplier 1: LCSC; Supplier Part Number 1: C174446; JLCPCB Part Number: C174446; Power Rating: 660mW; Category: Resistors; Package Size: 1210; JLCPCB Basic Part: Yes; Tolerance: ±1%; Voltage Rating: 200V; Temperature Coefficient: ±100ppm/℃; Temperature Rating: -55℃~+155℃; ComponentLink1Description: Datasheet; ComponentLink1URL: https://wmsc.lcsc.com/wmsc/upload/file/pdf/v2/lcsc/2304140030_Ever-Ohms-Tech-CRH1210F124RP05Z_C174446.pdf; ComponentLink2Description: JLCPCB Part URL; ComponentLink2URL: https://jlcpcb.com/partdetail/C174446
pins: 1, 2
1 alternate drawing of the same symbol

## CRH1210F180RP05Z
designator R?  Resistance: 180Ω  (hidden comment: *)
Resistor, 180Ω, ±1%, 660mW, 200V, ±100ppm/℃, -55℃~+155℃, SMD 1210; Manufacturer: Uniroyal; Manufacturer Part Number: CRH1210F180RP05Z; Supplier 1: LCSC; Supplier Part Number 1: C174453; JLCPCB Part Number: C174453; Power Rating: 660mW; Category: Resistors; Package Size: 1210; JLCPCB Basic Part: Yes; Tolerance: ±1%; Voltage Rating: 200V; Temperature Coefficient: ±100ppm/℃; Temperature Rating: -55℃~+155℃; ComponentLink1Description: Datasheet; ComponentLink1URL: https://wmsc.lcsc.com/wmsc/upload/file/pdf/v2/lcsc/2304140030_Ever-Ohms-Tech-CRH1210F180RP05Z_C174453.pdf; ComponentLink2Description: JLCPCB Part URL; ComponentLink2URL: https://jlcpcb.com/partdetail/C174453
pins: 1, 2
1 alternate drawing of the same symbol

## CRH1210F620KP05Z
designator R?  Resistance: 620kΩ  (hidden comment: *)
Resistor, 620kΩ, ±1%, 660mW, 200V, ±100ppm/℃, -55℃~+155℃, SMD 1210; Manufacturer: Uniroyal; Manufacturer Part Number: CRH1210F620KP05Z; Supplier 1: LCSC; Supplier Part Number 1: C174563; JLCPCB Part Number: C174563; Power Rating: 660mW; Category: Resistors; Package Size: 1210; JLCPCB Basic Part: Yes; Tolerance: ±1%; Voltage Rating: 200V; Temperature Coefficient: ±100ppm/℃; Temperature Rating: -55℃~+155℃; ComponentLink1Description: Datasheet; ComponentLink1URL: https://wmsc.lcsc.com/wmsc/upload/file/pdf/v2/lcsc/2304140030_Ever-Ohms-Tech-CRH1210F620KP05Z_C174563.pdf; ComponentLink2Description: JLCPCB Part URL; ComponentLink2URL: https://jlcpcb.com/partdetail/C174563
pins: 1, 2
1 alternate drawing of the same symbol